# Altium footprint library CUSTOM PCB.PcbLib: 404 footprints (part 14 of 26)
Each footprint in its own frame and in the unit in brackets; x right, y up, seen from the top. Pads: shape width x height; smd on the part's side, far side on the other; paste and mask are expansions set on the pad; w line width, h text height; cw(c..) or ccw(c..) is an arc to the next point about the centre after c.
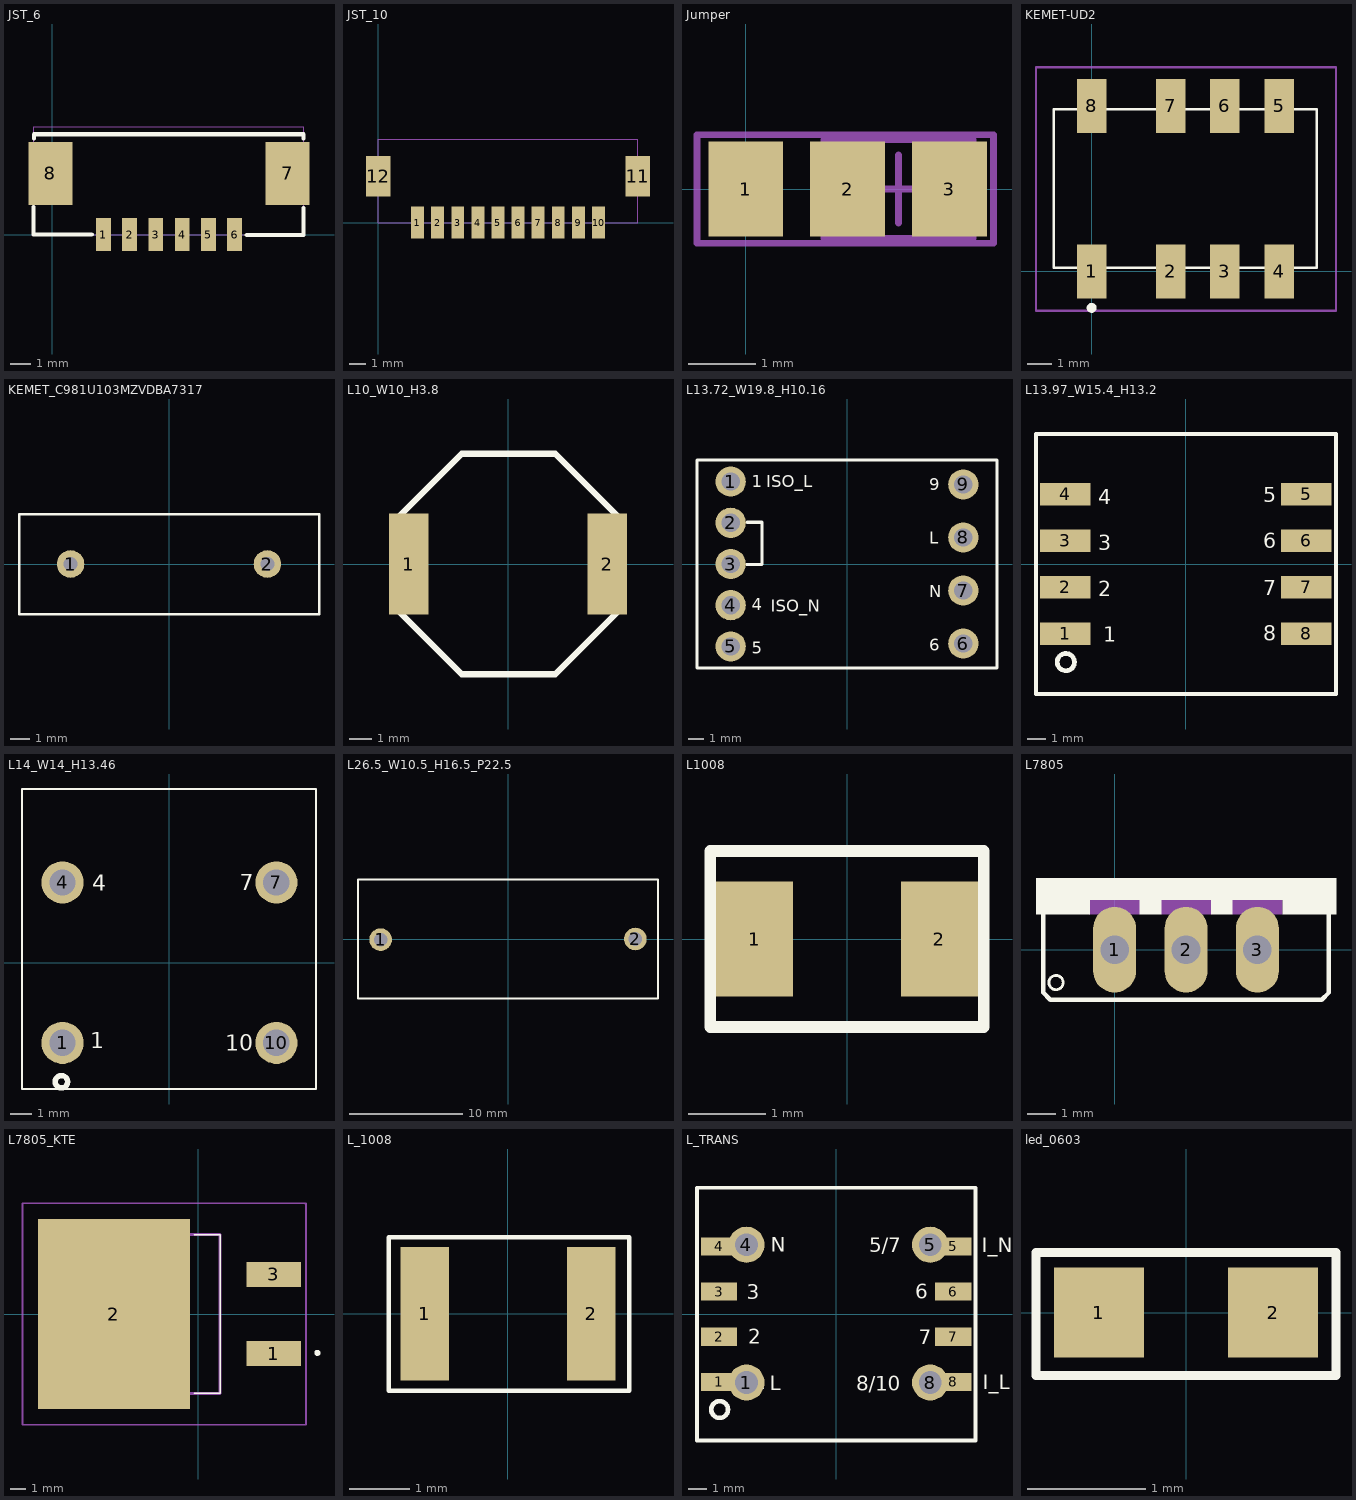
[diagram p13: the footprints below, top view; thin cyan lines are the x and y axes]

## JST_6 [mm]
pads (8):
  rect 0.7x1.6 smd: 1(2.438,0) 2(3.686,0) 3(4.933,0) 4(6.217,0) 5(7.465,0) 6(8.712,0)
  rect 2.1x3 smd: 7(11.252,2.921) 8(-0.102,2.921)
Top Overlay:
  lines w0.2: -0.914,1.321 -0.914,0 1.88,0 ; -0.889,4.597 -0.889,4.801 12.014,4.801 12.014,4.597 ; 9.296,-0.025 12.014,-0.025 12.014,1.27
Mechanical 1:
  lines w0.025: -0.889,0 -0.889,5.156 12.014,5.156 12.014,0 -0.889,0
3D body: height 3.4, standoff 0, extent -0.889,0 12.014,5.156

## JST_10 [mm] "smd"
pads (12):
  rect 0.8x2 smd: 1(2.438,0) 2(3.686,0) 3(4.933,0) 4(6.181,0) 5(7.428,0) 6(8.676,0) 7(9.923,0) 8(11.17,0) 9(12.418,0) 10(13.665,0)
  rect 1.5x2.5 smd: 11(16.104,2.87) 12(0,2.87)
Mechanical 1:
  lines w0.025: 0,0 16.104,0 16.104,5.156 0,5.156 0,0

## Jumper [mm] "Chip Capacitor, Body 2.0x1.3mm, IPC High Density"
height 1.4
pads (3):
  rect 1.1x1.4 smd: 1(0,0) 2(1.5,0) 3(3,0)
Mechanical 13:
  lines w0.1: 1.15,-0.725 3.35,-0.725 3.35,0.725 1.15,0.725 1.15,-0.725
Mechanical 15:
  lines w0.1: 1.75,0 2.75,0 ; 2.25,-0.5 2.25,0.5 ; -0.717,-0.8 -0.717,0.8 3.65,0.8 3.65,-0.8 -0.717,-0.8
3D body: height 1.4, standoff 0, extent 0.352,-0.722 2.552,0.728

## KEMET-UD2 [mm] "SMT DPDT 2A Relay"
pads (8):
  rect 1.2x2.2 smd: 1(0,0) 2(3.2,0) 3(5.4,0) 4(7.6,0) 5(7.6,6.706) 6(5.4,6.706) 7(3.2,6.706) 8(0,6.706)
Top Overlay:
  lines w0.1: -1.534,0.152 9.134,0.152 9.134,6.579 -1.534,6.579 -1.534,0.152
  lines w0.2: -0.1,-1.478 cw(c0,-1.478) 0.1,-1.478 cw(c0,-1.478) -0.1,-1.478
Mechanical 20:
  lines w0.1: -2.255,-1.6 9.905,-1.6 9.905,8.28 -2.255,8.28 -2.255,-1.6
3D body "UD2-3SNU.step": height 5.46, standoff 0, extent -1.792,-0.838 9.108,7.562

## KEMET_C981U103MZVDBA7317 [mm]
pads (2):
  round 1.4 hole 0.7: 1(-5,0) 2(5,0)
Top Overlay:
  lines w0.127: -7.62,-2.54 7.62,-2.54 7.62,2.54 -7.62,2.54 -7.62,-2.54
3D body "C981U103MZVDBA7317.step": height 19, standoff -19.8, extent -7.5,-2.501 7.5,2.501

## L10_W10_H3.8 [mm]
pads (2):
  rect 1.8x4.6 smd: 1(-4.5,0) 2(4.5,0)
Top Overlay:
  lines w0.3: -2.1,-5 -5,-2.1 -5,2.1 -2.1,5 ; -2.1,-5 2.139,-5 ; -2.1,-5 2.139,-5 ; -2.1,5 2.139,5 ; -2.1,5 2.139,5 ; 2.139,-5 5,-2.139 5,-2.1 5,2.1 5,2.139 2.139,5
3D body "STEP-WE-TPC-1038-rev1.stp": height 3.8, standoff 0, extent -5,-5 5,5

## L13.72_W19.8_H10.16 [mm]
pads (9):
  round 2 hole 1.2: 1(-7.675,5.44) 2(-7.675,2.72) 3(-7.675,0) 4(-7.675,-2.72) 5(-7.675,-5.44) 6(7.675,-5.25) 7(7.675,-1.75) 8(7.675,1.75) 9(7.675,5.25)
Top Overlay:
  lines w0.2: -6.64,-0.043 -5.6,-0.043 -5.6,2.755 -6.586,2.755 ; -9.9,-6.86 -9.9,0 -9.9,6.86 0,6.86 9.9,6.86 9.9,0 9.9,-6.86 0,-6.86 -9.9,-6.86
  text "N" at 5.413,-2.193 h0.8
  text "9" at 5.413,4.873 h0.8
  text "6" at 5.413,-5.727 h0.8
  text "5" at -6.277,-5.918 h0.8
  text "1" at -6.277,5.077 h0.8
  text "L" at 5.413,1.34 h0.8
  text "ISO_L" at -5.338,5.054 h0.8
  text "ISO_N" at -5.049,-3.135 h0.8
  text "4" at -6.277,-3.049 h0.8

## L13.97_W15.4_H13.2 [mm]
pads (8):
  rect 2.7x1.2 smd: 1(-6.475,-3.75) 2(-6.475,-1.25) 3(-6.475,1.25) 4(-6.475,3.75) 5(6.475,3.75) 6(6.475,1.25) 7(6.475,-1.25) 8(6.475,-3.75)
Top Overlay:
  circle w0.254: c-6.449,-5.275 r0.465
  lines w0.2: -8.052,-6.985 0,-6.985 8.077,-6.985 8.077,0.377 8.077,6.985 0,6.985 -8.052,6.985 -8.052,0.352 -8.052,-6.985
  text "1" at -4.445,-4.191 h0.8
  text "2" at -4.712,-1.726 h0.8
  text "3" at -4.712,0.739 h0.8
  text "4" at -4.712,3.204 h0.8
  text "5" at 4.166,3.313 h0.8
  text "6" at 4.166,0.848 h0.8
  text "7" at 4.166,-1.684 h0.8
  text "8" at 4.166,-4.115 h0.8

## L14_W14_H13.46 [mm]
pads (4):
  round 2 hole 1.25: 1(-5.08,-3.81) 4(-5.08,3.81) 7(5.08,3.81) 10(5.08,-3.81)
Top Overlay:
  circle w0.254: c-5.133,-5.656 r0.294
  lines w0.1: -7,-6 -7,1.002 -7,8.25 6.957,8.25 6.957,0.972 6.957,-6 -7,-6
  text "10" at 2.653,-4.19 h0.76
  text "7" at 3.349,3.447 h0.76
  text "4" at -3.661,3.424 h0.76
  text "1" at -3.754,-4.074 h0.76

## L26.5_W10.5_H16.5_P22.5 [mm]
pads (2):
  round 2 hole 1.2: 1(-11.25,-0.06) 2(11.25,0)
Top Overlay:
  lines w0.2: -13.25,-5.25 0,-5.25 13.25,-5.25 13.25,0 13.25,5.25 0,5.25 -13.25,5.25 -13.25,0 -13.25,-5.25
3D body "User Library-Film Capacitor 26_5x7x16mm.X_T": height 16, standoff -2, extent -13.25,-3.5 13.25,3.5

## L1008 [mm]
pads (2):
  rect 1x1.5 smd paste+0 mask+0: 1(-1.2,0) 2(1.2,0)
Top Overlay:
  lines w0.152: -1.778,-1.143 -1.778,1.143 1.778,1.143 1.778,-1.143 -1.778,-1.143
3D body "IND_NLV25T.step": height 1.96, standoff 0, extent -1.346,-1.054 1.346,1.054

## L7805 [mil]
pads (3):
  oval 60x120 hole 40: 1(0,0) 2(100,0) 3(200,0)
Top Overlay:
  circle w3.94: c-82,-46 r10
  region: -110.07,100 -35,100 -35,49.98 -110.07,49.98
  region: -35.21,100 35,100 35,69.95 -35.21,69.95
  region: 34.89,100 65,100 65,49.92 34.89,49.92
  region: 64.94,100 135,100 135,69.95 64.94,69.95
  region: 135.02,100 165,100 165,49.98 135.02,49.98
  region: 165.1,100 235,100 235,69.95 165.1,69.95
  region: 235.16,100 310,100 310,49.94 235.16,49.94
  lines w6: -100,55 -100,-60 -90,-70 290,-70 300,-60 300,55
Mechanical 4:
  region: -35.27,70 35,70 35,49.9 -35.27,49.9
  region: 64.99,70 135,70 135,49.98 64.99,49.98
  region: 165.06,70 235,70 235,49.95 165.06,49.95
  region: -35.27,70 35,70 35,49.9 -35.27,49.9
  region: 64.99,70 135,70 135,49.98 64.99,49.98
  region: 165.06,70 235,70 235,49.95 165.06,49.95
  text "-" at 74.99,-59.92 h73.82
  text "I" at -25.16,-60.03 h73.82
  text "O" at 175.06,-59.96 h73.82
  text "-" at 74.99,-59.92 h73.82
  text "I" at -25.16,-60.03 h73.82
  text "O" at 175.06,-59.96 h73.82
3D body "User Library-L7805.step": height 864.17, standoff -270.28, extent -101,-67.16 299,98

## L7805_KTE [mm]
pads (3):
  rect 3.5x1.6 smd: 1(4.86,-2.54) 3(4.86,2.54)
  rect 9.75x12.2 smd: 2(-5.415,0)
Top Overlay:
  lines w0.1: -0.25,-5.1 1.4,-5.1 1.4,5.1 -0.25,5.1
  lines w0.2: 7.65,-2.6 ccw(c7.65,-2.5) 7.65,-2.4 ccw(c7.65,-2.5) 7.65,-2.6
Mechanical 15:
  lines w0.2: -7.75,-5.1 -7.75,5.1 1.4,5.1 1.4,-5.1 -7.75,-5.1
Mechanical 20:
  lines w0.003: 6.833,7.073 6.914,7.073
  lines w0.1: 6.914,7.073 6.914,-7.1 -11.29,-7.1 -11.29,7.1 6.914,7.1

## L_1008 [mm]
pads (2):
  rect 0.8x2.2 smd: 1(-1.375,0) 2(1.375,0)
Top Overlay:
  lines w0.076: -1.97,-1.267 2,-1.267 2,1.264 -1.97,1.264 -1.97,-1.267
3D body "User Library-Chip Inductor (3).x_t": height 2, standoff 0, extent -1.25,-1.1 1.25,1.1

## L_TRANS [mm]
pads (12):
  rect 2x1 smd: 1(-6.475,-3.75) 2(-6.475,-1.25) 3(-6.475,1.25) 4(-6.475,3.75) 5(6.475,3.75) 6(6.475,1.25) 7(6.475,-1.25) 8(6.475,-3.75)
  round 2 hole 1.25: 1(-4.965,-3.781) 4(-4.965,3.839) 5(5.195,3.839) 8(5.195,-3.781)
Top Overlay:
  circle w0.254: c-6.448,-5.275 r0.465
  lines w0.1: -6.857,-6.943 7.1,-6.943 ; -6.857,7.001 7.1,7.001
  lines w0.2: -7.7,-6.985 0,-6.985 7.7,-6.985 7.7,0 7.7,6.985 0,6.985 -7.7,6.985 -7.7,0 -7.7,-6.985
  text "I_L" at 8.09,-4.145 h0.8
  text "I_N" at 8.039,3.411 h0.8
  text "N" at -3.619,3.455 h0.8
  text "L" at -3.68,-4.218 h0.8
  text "1" at -4.599,-4.149 h0.8
  text "2" at -4.852,-1.65 h0.8
  text "3" at -4.953,0.831 h0.8
  text "4" at -4.987,3.245 h0.8
  text "5/7" at 1.829,3.413 h0.8
  text "6" at 4.383,0.865 h0.8
  text "7" at 4.568,-1.668 h0.8
  text "8/10" at 1.112,-4.224 h0.8

## led_0603 [mil]
pads (2):
  rect 30x30 smd: 1(-29.02,0) 2(29.02,0)
Top Overlay:
  lines w3: -50,-21 50,-21 50,20 -50,20 -50,-21
3D body "User Library-LED SMD0603.STEP": height 24.76, standoff -1.81, extent -32.48,-14.27 32.48,14.27